# Altium footprint library XU-GENARAL PCB .PcbLib: 1176 footprints (part 62 of 75)
Each footprint in its own frame and in the unit in brackets; x right, y up, seen from the top. Pads: shape width x height; smd on the part's side, far side on the other; paste and mask are expansions set on the pad; w line width, h text height; cw(c..) or ccw(c..) is an arc to the next point about the centre after c.
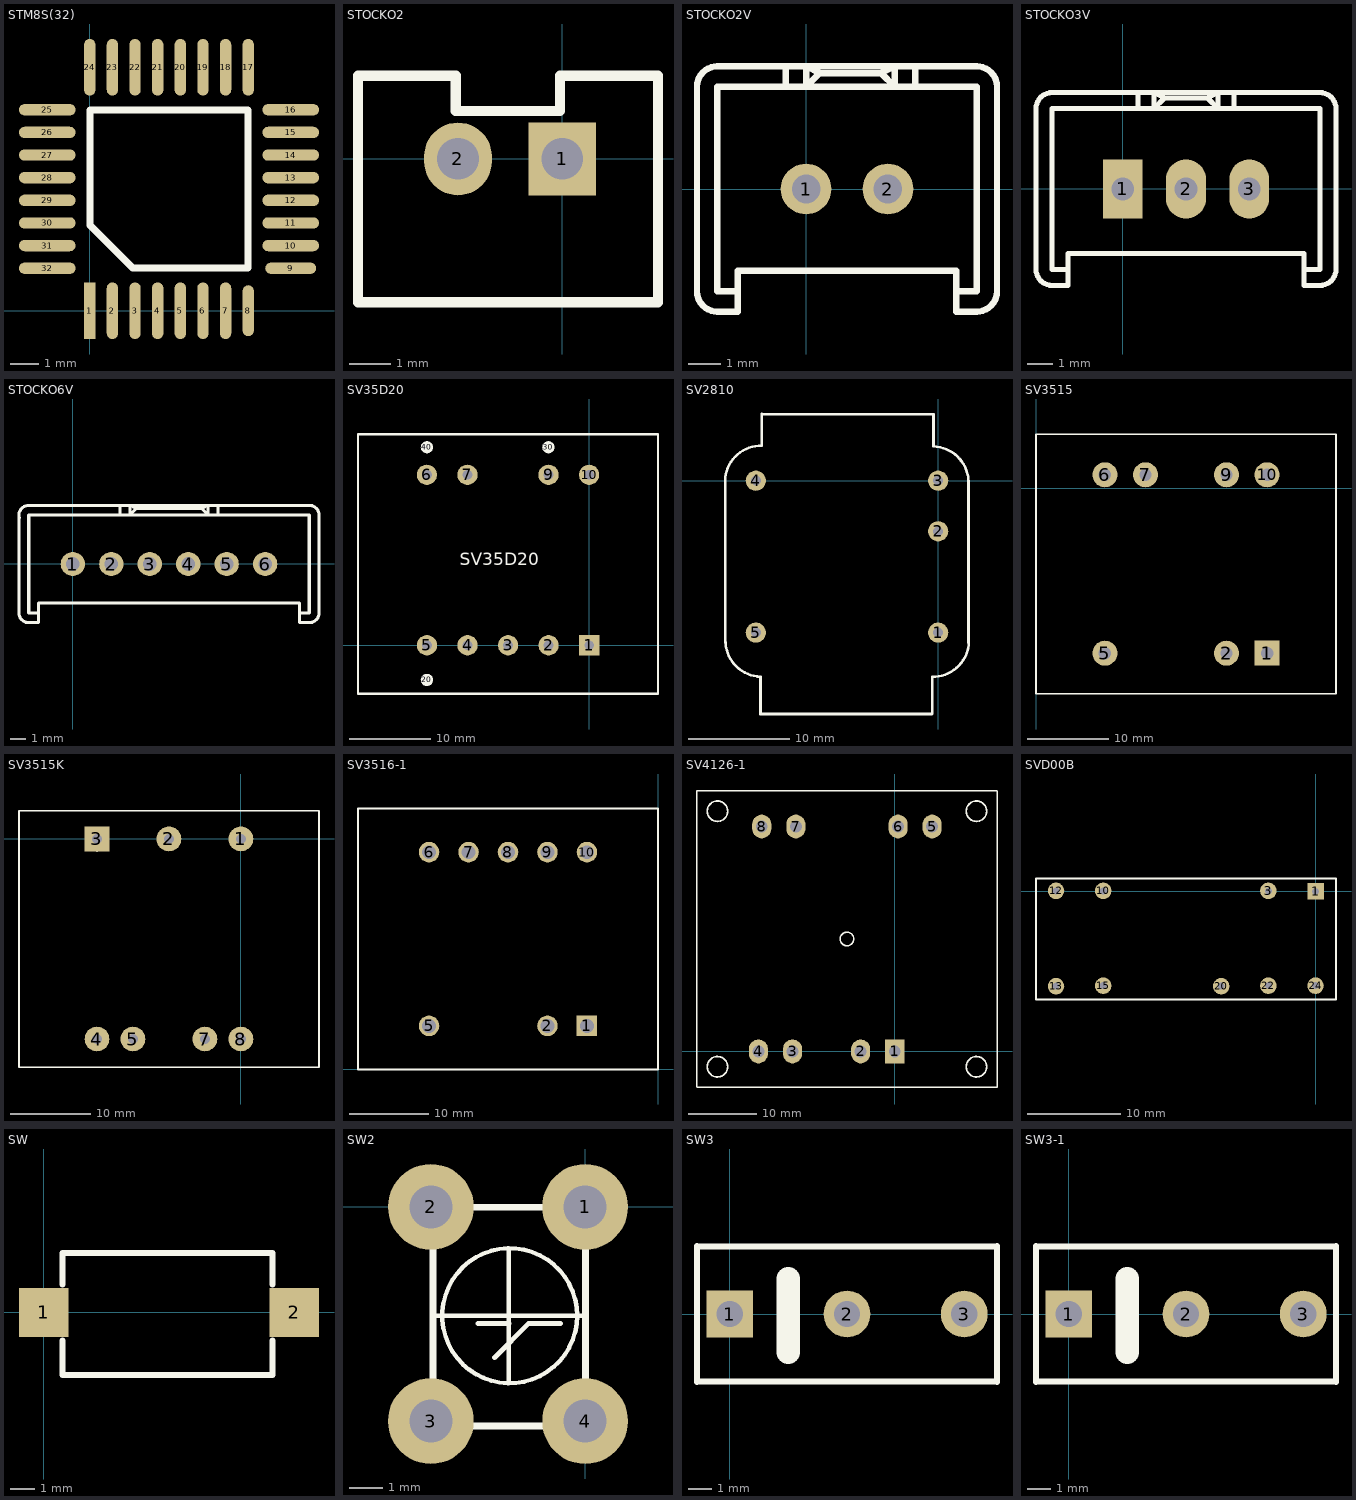
[diagram p61: the footprints below, top view; thin cyan lines are the x and y axes]

## STM8S(32) [mm]
pads (32):
  rect 0.4x2 smd: 1(0,0)
  oval 0.4x2 smd: 2(0.8,0) 3(1.6,0) 4(2.4,0) 5(3.2,0) 6(4,0) 7(4.8,0) 17(5.6,8.6) 18(4.8,8.6) 19(4,8.6) 20(3.2,8.6) 21(2.4,8.6) 22(1.6,8.6) 23(0.8,8.6) 24(0,8.6)
  oval 0.4x1.8 smd: 8(5.6,0)
  oval 1.8x0.4 smd: 9(7.1,1.5)
  oval 2x0.4 smd: 10(7.1,2.3) 11(7.1,3.1) 12(7.1,3.9) 13(7.1,4.7) 14(7.1,5.5) 15(7.1,6.3) 16(7.1,7.1) 25(-1.5,7.1) 26(-1.5,6.3) 27(-1.5,5.5) 28(-1.5,4.7) 29(-1.5,3.9) 30(-1.5,3.1) 31(-1.5,2.3) 32(-1.5,1.5)
Top Overlay:
  lines w0.254: 0.008,3.016 0.008,7.092 5.592,7.092 5.592,1.508 1.516,1.508 0.008,3.016

## STOCKO2 [mil]
pads (2):
  rect 65x70 hole 40: 1(0,0)
  oval 65x70 hole 40: 2(-100,0)
Top Overlay:
  lines w10: -196.06,-137.79 92.13,-137.79 92.13,80 -2,80 -2,46 -102,46 -102,80 -196.06,80 -196.06,-137.79

## STOCKO2V [mil]
pads (2):
  round 62 hole 35: 1(0,0) 2(100,0)
Top Overlay:
  lines w7.87: -83.33,-125 -108.33,-125 -108.33,125 208.33,125 208.33,-125 183.33,-125 ; -25,125 -25,150 ; 133.33,125 133.33,150 ; 16.67,141.67 0,125 0,150 16.67,141.67 ; 16.67,141.67 83.33,141.67 91.67,141.67 ; 91.67,141.67 108.33,125 108.33,150 91.67,141.67 ; -133.33,-125 ccw(c-108.33,-125) -108.33,-150 -83.33,-150 -83.33,-100 183.33,-100 183.33,-150 208.33,-150 ccw(c208.33,-125) 233.33,-125 233.33,125 ccw(c208.33,125) 208.33,150 -108.33,150 ccw(c-108.33,125) -133.33,125 -133.33,-125

## STOCKO3V [mil]
pads (3):
  rect 62x92 hole 35: 1(-0.26,-0.26)
  oval 62x92 hole 35: 2(98.08,-0.26) 3(196.41,-0.26)
Top Overlay:
  lines w7.87: 23.08,124.74 23.08,149.74 ; 173.08,124.74 173.08,149.74 ; -85.26,-125.26 -85.26,-150.26 -110.26,-150.26 cw(c-110.26,-125.26) -135.26,-125.26 -135.26,124.74 cw(c-110.26,124.74) -110.26,149.74 306.41,149.74 cw(c306.41,124.74) 331.41,124.74 331.41,-125.26 cw(c306.41,-125.26) 306.41,-150.26 281.41,-150.26 281.41,-125.26 ; -85.26,-125.26 -110.26,-125.26 -110.26,124.74 306.41,124.74 306.41,-125.26 281.41,-125.26 ; -85.26,-125.26 -85.26,-100.26 281.41,-100.26 281.41,-125.26 ; 64.74,141.41 48.08,124.74 48.08,149.74 64.74,141.41 ; 64.74,141.41 131.41,141.41 ; 131.41,141.41 148.08,124.74 148.08,149.74 131.41,141.41

## STOCKO6V [mil]
pads (6):
  round 62 hole 35: 1(-0.26,-0.26) 2(98.08,-0.26) 3(196.41,-0.26) 4(294.74,-0.26) 5(393.08,-0.26) 6(491.41,-0.26)
Top Overlay:
  lines w7.87: -137.76,124.74 -137.76,-125.26 ccw(c-112.76,-125.26) -112.76,-150.26 -87.76,-150.26 -87.76,-100.26 578.91,-100.26 578.91,-150.26 603.91,-150.26 ccw(c603.91,-125.26) 628.91,-125.26 628.91,124.74 ccw(c603.91,124.74) 603.91,149.74 -112.76,149.74 ccw(c-112.76,124.74) -136.53,117.02 ; -87.76,-125.26 -112.76,-125.26 -112.76,124.74 603.91,124.74 603.91,-125.26 578.91,-125.26 ; 120.58,124.74 120.58,149.74 ; 370.58,124.74 370.58,149.74 ; 162.24,141.41 145.58,124.74 145.58,149.74 162.24,141.41 ; 162.24,141.41 328.91,141.41 ; 328.91,141.41 345.58,124.74 345.58,149.74 328.91,141.41

## SV35D20 [mm]
pads (12):
  rect 2.5x2.5 hole 1.2: 1(0,0)
  round 2.5 hole 1.2: 2(-5,0) 3(-10,0) 4(-15,0) 5(-20,0) 6(-20.008,21.025) 7(-15.008,21.025) 9(-5.008,21.025) 10(-0.008,21.025)
  round 1.524 on Top Overlay: 20(-20.008,-4.277) 30(-5.022,24.425) 40(-20.008,24.425)
Top Overlay:
  lines w0.254: -28.508,-5.975 8.492,-5.975 8.492,26.025 -28.508,26.025 -28.508,-5.975
  text "SV35D20" at -15.951,9.855 h1.52

## SV2810 [mm]
pads (5):
  round 2 hole 1: 1(0,-15) 2(0,-5) 3(0,0) 4(-18,0) 5(-18,-15)
Top Overlay:
  lines w0.254: -21.033,-0.001 cw(c-17.476,-0.1) -17.399,3.457 -17.399,5.743 -17.399,6.584 ; -21.006,-16.002 -21.006,-0.002 ; -21,-15.723 ccw(c-17.443,-15.799) -17.541,-19.356 -17.541,-21.478 -17.541,-22.393 -17.541,-23.028 ; -17.551,-23.038 -0.61,-23.038 ; -17.399,6.579 -0.488,6.579 ; -0.6,-23.028 -0.6,-22.393 -0.6,-21.478 -0.6,-19.356 ccw(c-0.523,-15.799) 3.034,-15.898 ; -0.459,6.577 -0.459,6.148 -0.459,5.307 -0.459,3.38 cw(c-0.557,-0.177) 3,-0.254 ; 3,-16 3,0

## SV3515 [mil]
pads (7):
  rect 121.42x121.42 hole 60: 1(1121,-802)
  round 121.42 hole 60: 2(924.15,-802) 5(333.6,-802) 6(333.6,64.14) 7(530.45,64.14) 9(924.15,64.14) 10(1121,64.14)
Top Overlay:
  lines w7.87: -1.05,-998.85 1455.65,-998.85 1455.65,260.99 -1.05,260.99 -1.05,-998.85

## SV3515K [mil]
pads (7):
  round 121.42 hole 50: 1(0,0) 2(-354,0) 4(-708,-984) 5(-531,-984) 7(-177,-984) 8(0,-984)
  rect 121.42x121.42 hole 50: 3(-708,0)
Top Overlay:
  lines w7.87: -708,48 -708,-59 -707,-60 ; 383.15,137.85 365.05,137.85 -1091.65,137.85 -1091.65,-1121.99 365.05,-1121.99 383.99,-1121.99 384,137.84

## SV3516-1 [mm]
pads (8):
  rect 2.6x2.6 hole 1.75: 1(-9,5.5)
  round 2.6 hole 1.75: 2(-14,5.5) 5(-29,5.5) 6(-29,27.5) 7(-24,27.5) 8(-19,27.5) 9(-14,27.5) 10(-9,27.5)
Top Overlay:
  lines w0.254: -38,0 0,0 0,33 -38,33 -38,0

## SV4126-1 [mm]
pads (8):
  rect 2.8x3.5 hole 1.75: 1(0,0)
  oval 2.8x3.5 hole 1.75: 2(-5,0) 3(-14.997,0) 4(-20,0) 5(5.486,33) 6(0.486,33) 7(-14.514,33) 8(-19.514,33)
Top Overlay:
  circle w0.254: c-7.014,16.5 r1
  circle w0.254: c11.986,35.25 r1.5
  circle w0.254: c-26.014,-2.25 r1.5
  circle w0.254: c-26.014,35.25 r1.5
  circle w0.254: c11.986,-2.25 r1.5
  lines w0.2: -29.014,-5.25 -29.014,38.25 14.986,38.25 ; -29,-5.258 15,-5.258 15,38.242

## SVD00B [mil]
pads (9):
  rect 70x70 hole 30: 1(0,0)
  round 70 hole 30: 3(-200,2) 10(-900,2) 12(-1100,2) 13(-1100,-402) 15(-900,-400) 20(-400,-402) 22(-200,-400) 24(0,-400)
Top Overlay:
  lines w8: -1184.95,-457.91 86.7,-457.91 86.7,53.9 -1184.95,53.9 -1184.95,-457.91

## SW [mm]
pads (2):
  rect 2x2 smd: 1(0,0) 2(10.16,0)
Top Overlay:
  lines w0.254: 0.762,-1.143 0.762,-2.54 9.271,-2.54 9.271,-1.143 ; 0.762,1.143 0.762,2.413 9.271,2.413 9.271,1.143

## SW2 [mil]
pads (4):
  round 100 hole 50: 1(0,0) 2(-180,0) 3(-180,-250) 4(0,-250)
Top Overlay:
  circle w5: c-88,-127 r78.74
  lines w5: -177.48,-127 0.47,-127 ; -89,-206 -89,-126 ; -89,-127 -89,-48
  lines w5.91: -124.76,-135.91 -88.76,-135.91 ; -105.76,-175.91 -65.76,-135.91 -28.76,-135.91
  lines w7.87: -177.48,-206.38 -177.48,-47.32 ; -131.81,-0.47 -45.98,-0.47 ; -129.84,-255.59 -46.38,-255.59 ; 0.47,-204.8 0.47,-47.32

## SW3 [mil]
pads (3):
  rect 80x80 hole 45: 1(0,0)
  round 80 hole 45: 2(200,0) 3(400,0)
Top Overlay:
  lines w10: -55.91,-116.14 -55.91,116.14 ; -55,-115 455,-115 ; -55,115 455,115 ; 455.91,-116.14 455.91,116.14
  lines w40: 100,-65 100,60

## SW3-1 [mil]
pads (3):
  rect 80x80 hole 45: 1(0,0)
  round 80 hole 45: 2(200,0) 3(400,0)
Top Overlay:
  lines w10: -55.91,-116.14 -55.91,116.14 ; -55,-115 455,-115 ; -55,115 455,115 ; 455.91,-116.14 455.91,116.14
  lines w40: 100,-65 100,60